# Altium footprint library bethu.PcbLib: 628 footprints (part 14 of 40)
Each footprint in its own frame and in the unit in brackets; x right, y up, seen from the top. Pads: shape width x height; smd on the part's side, far side on the other; paste and mask are expansions set on the pad; w line width, h text height; cw(c..) or ccw(c..) is an arc to the next point about the centre after c.
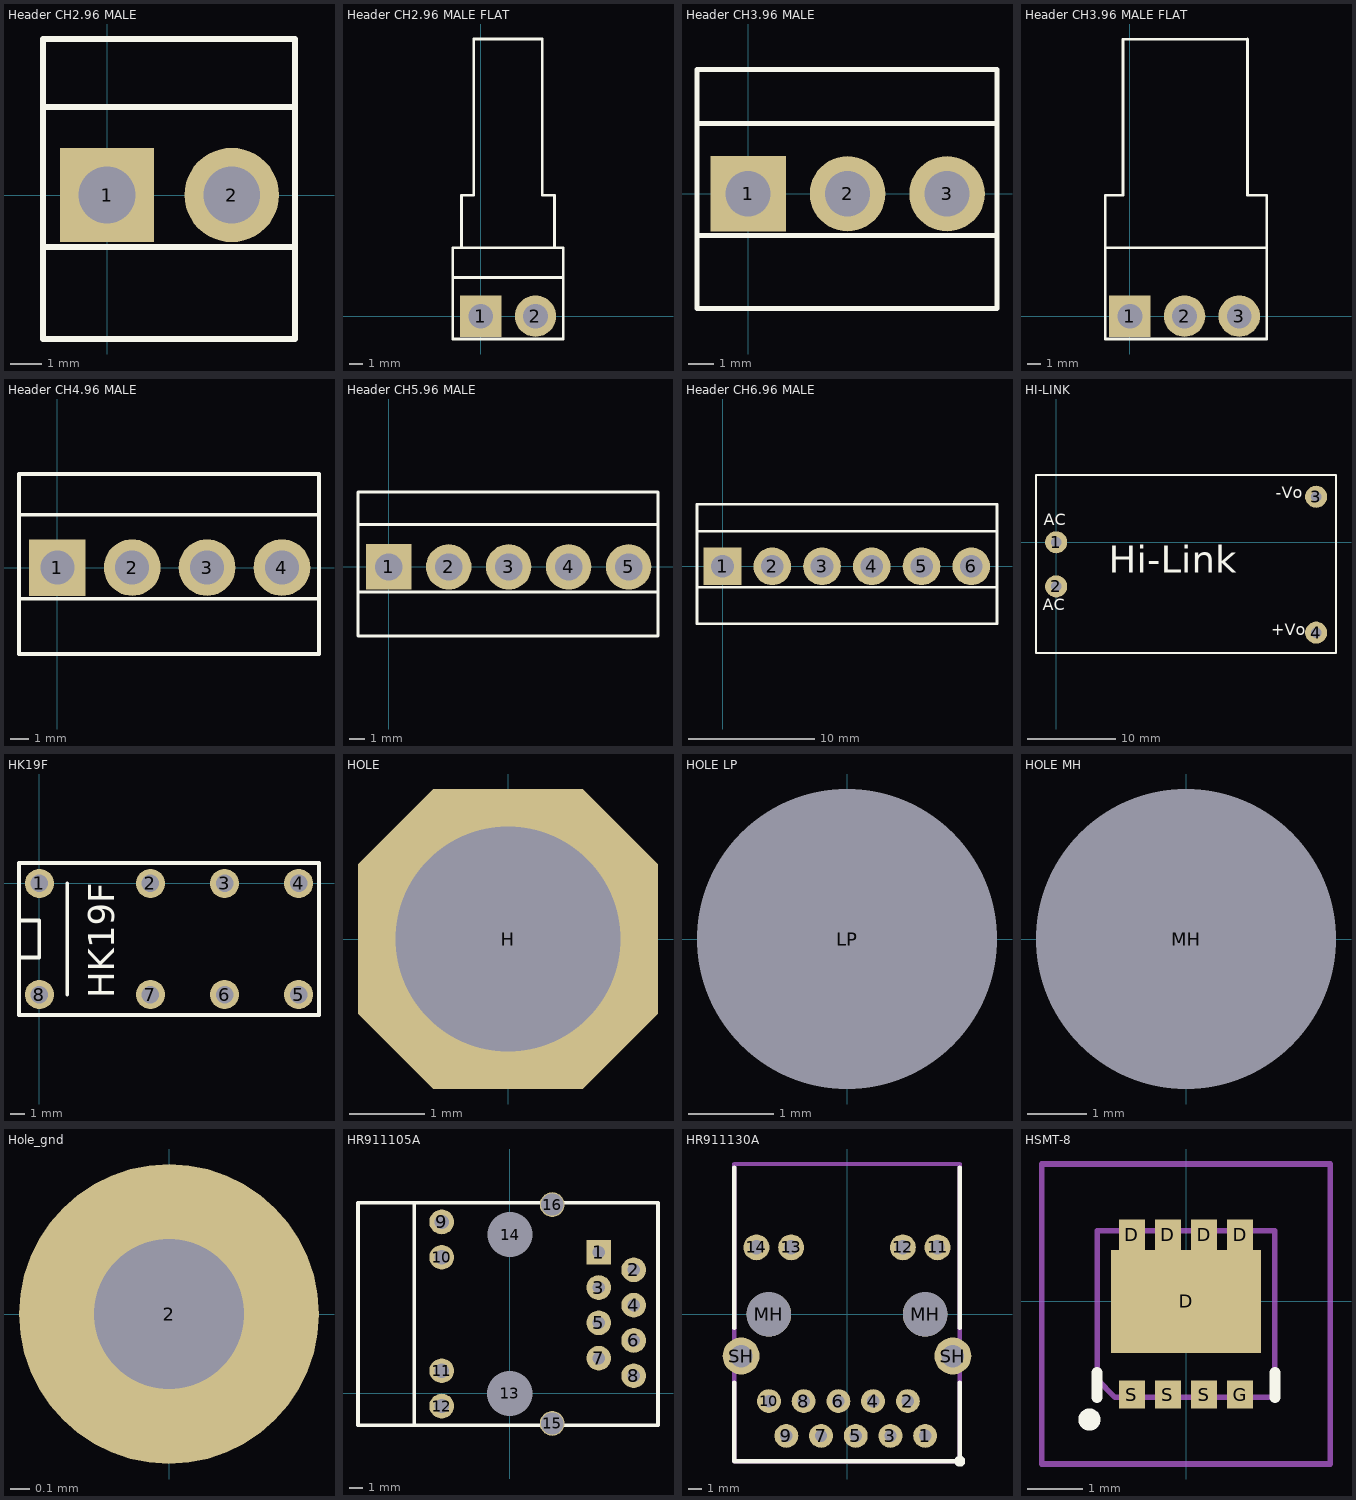
[diagram p13: the footprints below, top view; thin cyan lines are the x and y axes]

## Header CH2.96 MALE [mm]
pads (2):
  rect 3x3 hole 1.8: 1(0,0)
  round 3 hole 1.8: 2(3.96,0)
Top Overlay:
  lines w0.2: -2.032,-1.651 5.969,-1.651 ; -2.032,2.794 5.969,2.794 ; -2.032,-4.572 5.969,-4.572 5.969,4.953 -2.032,4.953 -2.032,-4.572
3D body "User Library-Cvilux_CI5102P1V00.STEP": height 13.9, standoff -3.6, extent -1.98,-4.62 5.94,4.981

## Header CH2.96 MALE FLAT [mm]
pads (2):
  rect 3x3 hole 1.8: 1(0,0)
  round 3 hole 1.8: 2(3.96,0)
Top Overlay:
  lines w0.2: -2.032,2.794 5.969,2.794 ; -1.397,5.08 -1.397,8.763 -0.508,8.763 -0.508,20.069 4.445,20.075 4.445,8.763 5.334,8.763 5.334,4.953 ; -2.032,-1.651 5.969,-1.651 5.969,4.953 -2.032,4.953 -2.032,-1.651
3D body "4516.stp": height 9.86, standoff -4.11, extent -1.854,-0.635 5.918,20.079

## Header CH3.96 MALE [mm]
pads (3):
  rect 3x3 hole 1.8: 1(0,0)
  round 3 hole 1.8: 2(3.96,0) 3(7.92,0)
Top Overlay:
  lines w0.2: -2.032,-1.651 9.906,-1.651 ; -2.032,2.794 9.906,2.794 ; -2.032,-4.572 -2.032,4.953 9.906,4.953 9.906,-4.572 -2.032,-4.572
3D body "User Library-Cvilux_CI5103P1V00.STEP": height 13.9, standoff -3.6, extent -1.98,-4.62 9.9,4.981

## Header CH3.96 MALE FLAT [mm]
pads (3):
  rect 3x3 hole 1.8: 1(0,0)
  round 3 hole 1.8: 2(3.96,0) 3(7.92,0)
Top Overlay:
  lines w0.2: -1.778,4.953 9.906,4.953 ; 9.906,4.953 9.906,-1.651 -1.778,-1.651 -1.778,5.207 -1.778,8.763 -0.508,8.763 -0.508,20.066 8.509,20.077 8.509,8.763 9.906,8.763 9.906,4.953
3D body "4879.stp": height 9.86, standoff -4.11, extent -1.803,-0.635 9.931,20.079

## Header CH4.96 MALE [mm]
pads (4):
  rect 3x3 hole 1.8: 1(0,0)
  round 3 hole 1.8: 2(3.96,0) 3(7.92,0) 4(11.88,0)
Top Overlay:
  lines w0.2: -2.032,-1.651 13.843,-1.651 ; -2.032,2.794 13.843,2.794 ; -2.032,-4.572 -2.032,4.953 13.843,4.953 13.843,-4.572 -2.032,-4.572
3D body "User Library-Cvilux_CI5104P1V00.STEP": height 13.9, standoff -3.6, extent -1.98,-4.62 13.86,4.981

## Header CH5.96 MALE [mm]
pads (5):
  rect 3x3 hole 1.8: 1(0,0)
  round 3 hole 1.8: 2(3.96,0) 3(7.92,0) 4(11.88,0) 5(15.84,0)
Top Overlay:
  lines w0.2: -2.032,-1.651 17.78,-1.651 ; -2.032,2.794 17.78,2.794 ; -2.032,-4.572 17.78,-4.572 17.78,4.953 -2.032,4.953 -2.032,-4.572
3D body "User Library-Cvilux_CI5105P1V00.STEP": height 13.9, standoff -3.6, extent -1.98,-4.62 17.82,4.981

## Header CH6.96 MALE [mm]
pads (6):
  rect 3x3 hole 1.8: 1(0,0)
  round 3 hole 1.8: 2(3.96,0) 3(7.92,0) 4(11.88,0) 5(15.84,0) 6(19.8,0)
Top Overlay:
  lines w0.2: -2.032,-1.651 21.844,-1.651 ; -2.032,2.794 21.844,2.794 ; -2.032,-4.572 21.844,-4.572 21.844,4.953 -2.032,4.953 -2.032,-4.572
3D body "User Library-Cvilux_CI5106P1V00.STEP": height 13.9, standoff -3.6, extent -1.98,-4.62 21.78,4.981

## HI-LINK [mm]
pads (4):
  round 2.5 hole 1.2: 1(0,0) 2(0,-5) 3(29.464,5.16) 4(29.464,-10.24)
Top Overlay:
  lines w0.254: -2.286,-12.56 31.714,-12.56 31.714,7.64 -2.286,7.64 -2.286,-12.56
  text "Hi-Link" at 5.969,-3.476 h3.05
  text "+Vo" at 24.384,-10.969 h2.29
  text "-Vo" at 24.892,4.525 h2.29
  text "AC" at -1.524,-8.175 h2.29
  text "AC" at -1.397,1.477 h2.29
3D body "hilink.SLDPRT": height 15.5, standoff -5, extent -2.286,-12.58 31.714,7.62

## HK19F [mm]
pads (8):
  round 2 hole 1.2: 1(0,0) 2(7.62,0) 3(12.7,0) 4(17.78,0) 5(17.78,-7.62) 6(12.7,-7.62) 7(7.62,-7.62) 8(0,-7.62)
Top Overlay:
  lines w0.254: -1.397,-5.08 0,-5.08 0,-2.54 -1.397,-2.54 ; 1.905,-7.62 1.905,0 ; -1.397,-9.017 -1.397,1.397 19.177,1.397 19.177,-9.017 -1.397,-9.017
  text "HK19F" at 5.715,-7.874 h3.05
3D body "User Library-Relay PCB Type HK19F.STEP": height 12, standoff -3.5, extent -1.21,-8.81 18.99,1.19

## HOLE [mm]
pads (1):
  oct 4x4 hole 3: H(0,0)

## HOLE LP [mm]
pads (1):
  round 3.2 hole 3.5: LP(0,0)

## HOLE MH [mm]
pads (1):
  round 4.8 hole 5.1: MH(0,0)

## Hole_gnd [mil]
pads (1):
  round 60 hole 30: 2(0,0)

## HR911105A [mil]
pads (16):
  rect 70x70 hole 35.04 unplated: 1(252,400)
  round 70 hole 35.04 unplated: 2(351,350) 3(252,300) 4(351,250) 5(252,200) 6(351,150) 7(252,100) 8(351,50)
  round 70 hole 40.16 unplated: 9(-192.91,485.83) 10(-192.91,385.83) 11(-192.91,64.17) 12(-192.91,-35.83)
  round 70 hole 127.95 unplated: 13(0,0) 14(1,450)
  round 70 hole 62.99 unplated: 15(120.08,-85.04) 16(120.08,535.04)
Top Overlay:
  lines w10: -270,-90 -270,540 ; -430,-90 420,-90 420,540 -430,540 -430,-90
3D body "User Library-HR911105A.STEP": height 531.5, standoff -118.11, extent -427.52,-87.6 415,537.6

## HR911130A [mm]
pads (18):
  round 1.75 hole 0.9: 1(5.72,-8.89) 2(4.45,-6.35) 3(3.18,-8.89) 4(1.91,-6.35) 5(0.64,-8.89) 6(-0.63,-6.35) 7(-1.9,-8.89) 8(-3.17,-6.35) 9(-4.44,-8.89) 10(-5.71,-6.35)
  round 1.9 hole 1.05: 11(6.625,4.9) 12(4.085,4.9) 13(-4.085,4.9) 14(-6.625,4.9)
  round 3.25 hole 3.25 unplated: MH(-5.715,0) MH(5.715,0)
  round 2.7 hole 1.65: SH(-7.745,-3.05) SH(7.745,-3.05)
Top Overlay:
  circle w0.4: c8.25,-10.75 r0.2
  lines w0.3: -8.25,-5 -8.25,-10.75 8.25,-10.75 8.25,-5 ; -8.25,-1 -8.25,10.75 ; 8.25,-1 8.25,10.75
Mechanical 13:
  lines w0.3: -8.25,-10.75 8.25,-10.75 8.25,11 -8.25,11 -8.25,-10.75
  text "'.Designator'" at -5.665,-0.417 h1
  text "1" at 7.333,-9.5 h1
3D body "HR911130A.STEP": height 13.51, standoff -2.99, extent -7.94,-10.49 7.94,10.91

## HSMT-8 [mm]
pads (9):
  rect 0.47x0.55 smd: D(-0.975,1.2) D(-0.325,1.2) D(0.325,1.2) D(0.975,1.2)
  rect 2.7x1.85 smd: D(0,0)
  rect 0.47x0.5 smd: G(0.975,-1.675) S(-0.975,-1.675) S(-0.325,-1.675) S(0.325,-1.675)
Top Overlay:
  lines w0.2: -1.6,-1.725 -1.6,-1.275 ; 1.6,-1.725 1.6,-1.275 ; -1.839,-2.125 ccw(c-1.739,-2.125) -1.639,-2.125 ccw(c-1.739,-2.125) -1.839,-2.125
Mechanical 13:
  lines w0.1: -1.6,-1.4 -1.6,1.275 1.6,1.275 1.6,-1.725 -1.275,-1.725 -1.6,-1.4
  text "'.Designator'" at -6.315,-1.4 h1
Mechanical 15:
  lines w0.1: -2.6,-2.925 2.6,-2.925 2.6,2.475 -2.6,2.475 -2.6,-2.925
3D body "RQ3E150GNTB.stp": height 1, standoff 0, extent -1.6,-1.878 1.6,1.428